# Altium schematic symbol library jlcpcb_2025_04_capacitors_extended_0603.schlib: 3668 symbols (part 18 of 20) (continued)
## JMK107BC6226MA-T
designator C?  Capacitance: 22uF  (hidden comment: *)
Capacitor, Ceramic (MLCC), 22uF, ±20%, 6.3V, X6S, ±20%, SMD 0603; Manufacturer: Taiyo Yuden; Manufacturer Part Number: JMK107BC6226MA-T; Package Size: 0603; JLCPCB Basic Part: No; JLCPCB Part Number: C386015; Supplier 1: LCSC; Category: Capacitors - MLCC; Supplier Part Number 1: C386015; Tolerance: ±20%; Voltage Rating: 6.3V; Temperature Coefficient: X6S; RoHS: Yes; ComponentLink1Description: Datasheet; ComponentLink1URL: https://wmsc.lcsc.com/wmsc/upload/file/pdf/v2/lcsc/2211282230_Taiyo-Yuden-JMK107BC6226MA-T_C386015.pdf; ComponentLink2Description: JLCPCB Part URL; ComponentLink2URL: https://jlcpcb.com/partdetail/C386015; ComponentLink3Description: LCSC Part URL; ComponentLink3URL: https://lcsc.com/product-detail/Multilayer-Ceramic-Capacitors-MLCC---SMD-SMT_Taiyo-Yuden-Taiyo-Yuden-JMK107BC6226MA-T_C386015.html
footprint CAP-0603 (0603 (1608M) Capacitor)
pins: 1, 2

## JMK107BJ106KA-T
designator C?  Capacitance: 10uF  (hidden comment: *)
Capacitor, Ceramic (MLCC), 10uF, ±10%, 6.3V, X5R, ±10%, SMD 0603; Manufacturer: Taiyo Yuden; Manufacturer Part Number: JMK107BJ106KA-T; Package Size: 0603; JLCPCB Basic Part: No; JLCPCB Part Number: C92782; Supplier 1: LCSC; Category: Capacitors - MLCC; Supplier Part Number 1: C92782; Tolerance: ±10%; Voltage Rating: 6.3V; Temperature Coefficient: X5R; RoHS: Yes; ComponentLink1Description: Datasheet; ComponentLink1URL: https://wmsc.lcsc.com/wmsc/upload/file/pdf/v2/lcsc/2304140030_Taiyo-Yuden-JMK107BJ106KA-T_C92782.pdf; ComponentLink2Description: JLCPCB Part URL; ComponentLink2URL: https://jlcpcb.com/partdetail/C92782; ComponentLink3Description: LCSC Part URL; ComponentLink3URL: https://lcsc.com/product-detail/Multilayer-Ceramic-Capacitors-MLCC---SMD-SMT_Taiyo-Yuden-Taiyo-Yuden-JMK107BJ106KA-T_C92782.html
footprint CAP-0603 (0603 (1608M) Capacitor)
pins: 1, 2

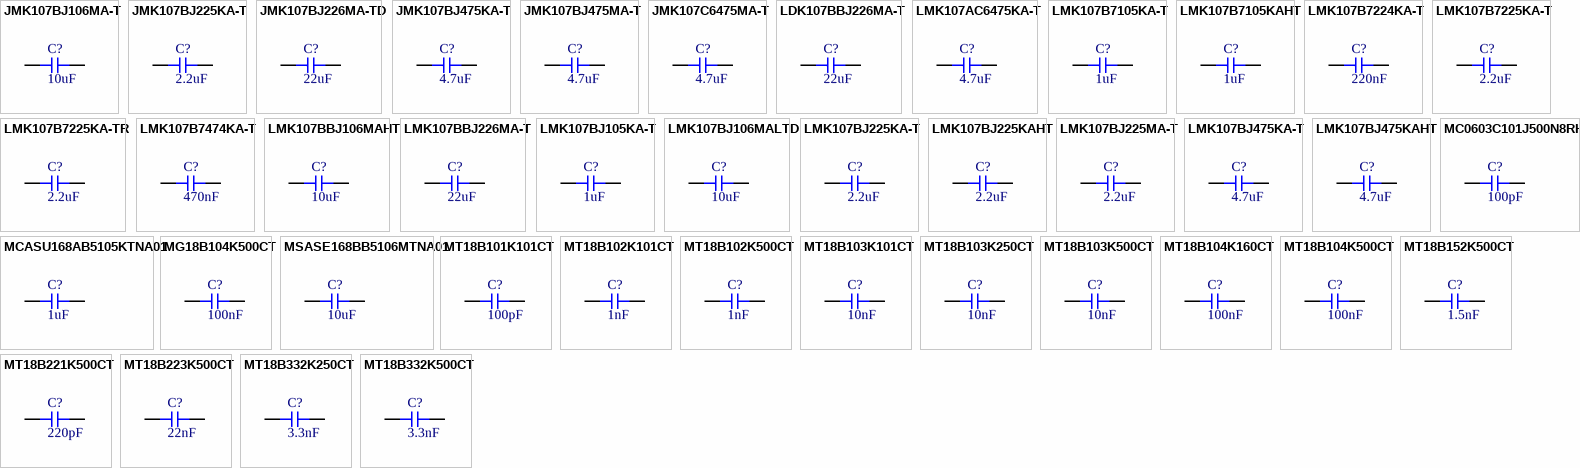
[diagram p82: symbols JMK107BJ106MA-T to MT18B332K500CT]

## JMK107BJ106MA-T
designator C?  Capacitance: 10uF  (hidden comment: *)
Capacitor, Ceramic (MLCC), 10uF, ±20%, 6.3V, X5R, ±20%, SMD 0603; Manufacturer: Taiyo Yuden; Manufacturer Part Number: JMK107BJ106MA-T; Package Size: 0603; JLCPCB Basic Part: No; JLCPCB Part Number: C87152; Supplier 1: LCSC; Category: Capacitors - MLCC; Supplier Part Number 1: C87152; Tolerance: ±20%; Voltage Rating: 6.3V; Temperature Coefficient: X5R; RoHS: Yes; ComponentLink1Description: Datasheet; ComponentLink1URL: https://wmsc.lcsc.com/wmsc/upload/file/pdf/v2/lcsc/2211282300_Taiyo-Yuden-JMK107BJ106MA-T_C87152.pdf; ComponentLink2Description: JLCPCB Part URL; ComponentLink2URL: https://jlcpcb.com/partdetail/C87152; ComponentLink3Description: LCSC Part URL; ComponentLink3URL: https://lcsc.com/product-detail/Multilayer-Ceramic-Capacitors-MLCC---SMD-SMT_Taiyo-Yuden-Taiyo-Yuden-JMK107BJ106MA-T_C87152.html
footprint CAP-0603 (0603 (1608M) Capacitor)
pins: 1, 2

## JMK107BJ225KA-T
designator C?  Capacitance: 2.2uF  (hidden comment: *)
Capacitor, Ceramic (MLCC), 2.2uF, ±10%, 6.3V, X5R, ±10%, SMD 0603; Manufacturer: Taiyo Yuden; Manufacturer Part Number: JMK107BJ225KA-T; Package Size: 0603; JLCPCB Basic Part: No; JLCPCB Part Number: C92783; Supplier 1: LCSC; Category: Capacitors - MLCC; Supplier Part Number 1: C92783; Tolerance: ±10%; Voltage Rating: 6.3V; Temperature Coefficient: X5R; RoHS: Yes; ComponentLink1Description: Datasheet; ComponentLink1URL: https://wmsc.lcsc.com/wmsc/upload/file/pdf/v2/lcsc/2211282300_Taiyo-Yuden-JMK107BJ225KA-T_C92783.pdf; ComponentLink2Description: JLCPCB Part URL; ComponentLink2URL: https://jlcpcb.com/partdetail/C92783; ComponentLink3Description: LCSC Part URL; ComponentLink3URL: https://lcsc.com/product-detail/Multilayer-Ceramic-Capacitors-MLCC---SMD-SMT_Taiyo-Yuden-Taiyo-Yuden-JMK107BJ225KA-T_C92783.html
footprint CAP-0603 (0603 (1608M) Capacitor)
pins: 1, 2

## JMK107BJ226MA-TD
designator C?  Capacitance: 22uF  (hidden comment: *)
Capacitor, Ceramic (MLCC), 22uF, ±20%, 6.3V, X5R, ±20%, SMD 0603; Manufacturer: Taiyo Yuden; Manufacturer Part Number: JMK107BJ226MA-TD; Package Size: 0603; JLCPCB Basic Part: No; JLCPCB Part Number: C386017; Supplier 1: LCSC; Category: Capacitors - MLCC; Supplier Part Number 1: C386017; Tolerance: ±20%; Voltage Rating: 6.3V; Temperature Coefficient: X5R; RoHS: Yes; ComponentLink1Description: Datasheet; ComponentLink1URL: https://wmsc.lcsc.com/wmsc/upload/file/pdf/v2/lcsc/2211282230_Taiyo-Yuden-JMK107BJ226MA-TD_C386017.pdf; ComponentLink2Description: JLCPCB Part URL; ComponentLink2URL: https://jlcpcb.com/partdetail/C386017; ComponentLink3Description: LCSC Part URL; ComponentLink3URL: https://lcsc.com/product-detail/Multilayer-Ceramic-Capacitors-MLCC---SMD-SMT_Taiyo-Yuden-Taiyo-Yuden-JMK107BJ226MA-TD_C386017.html
footprint CAP-0603 (0603 (1608M) Capacitor)
pins: 1, 2

## JMK107BJ475KA-T
designator C?  Capacitance: 4.7uF  (hidden comment: *)
Capacitor, Ceramic (MLCC), 4.7uF, ±10%, 6.3V, X5R, ±10%, SMD 0603; Manufacturer: Taiyo Yuden; Manufacturer Part Number: JMK107BJ475KA-T; Package Size: 0603; JLCPCB Basic Part: No; JLCPCB Part Number: C87151; Supplier 1: LCSC; Category: Capacitors - MLCC; Supplier Part Number 1: C87151; Tolerance: ±10%; Voltage Rating: 6.3V; Temperature Coefficient: X5R; RoHS: Yes; ComponentLink1Description: Datasheet; ComponentLink1URL: https://wmsc.lcsc.com/wmsc/upload/file/pdf/v2/lcsc/2304140030_Taiyo-Yuden-JMK107BJ475KA-T_C87151.pdf; ComponentLink2Description: JLCPCB Part URL; ComponentLink2URL: https://jlcpcb.com/partdetail/C87151; ComponentLink3Description: LCSC Part URL; ComponentLink3URL: https://lcsc.com/product-detail/Multilayer-Ceramic-Capacitors-MLCC---SMD-SMT_Taiyo-Yuden-Taiyo-Yuden-JMK107BJ475KA-T_C87151.html
footprint CAP-0603 (0603 (1608M) Capacitor)
pins: 1, 2

## JMK107BJ475MA-T
designator C?  Capacitance: 4.7uF  (hidden comment: *)
Capacitor, Ceramic (MLCC), 4.7uF, ±20%, 6.3V, X5R, ±20%, SMD 0603; Manufacturer: Taiyo Yuden; Manufacturer Part Number: JMK107BJ475MA-T; Package Size: 0603; JLCPCB Basic Part: No; JLCPCB Part Number: C412628; Supplier 1: LCSC; Category: Capacitors - MLCC; Supplier Part Number 1: C412628; Tolerance: ±20%; Voltage Rating: 6.3V; Temperature Coefficient: X5R; RoHS: Yes; ComponentLink1Description: Datasheet; ComponentLink1URL: https://wmsc.lcsc.com/wmsc/upload/file/pdf/v2/lcsc/2304140030_Taiyo-Yuden-JMK107BJ475MA-T_C412628.pdf; ComponentLink2Description: JLCPCB Part URL; ComponentLink2URL: https://jlcpcb.com/partdetail/C412628; ComponentLink3Description: LCSC Part URL; ComponentLink3URL: https://lcsc.com/product-detail/Multilayer-Ceramic-Capacitors-MLCC---SMD-SMT_Taiyo-Yuden-Taiyo-Yuden-JMK107BJ475MA-T_C412628.html
footprint CAP-0603 (0603 (1608M) Capacitor)
pins: 1, 2

## JMK107C6475MA-T
designator C?  Capacitance: 4.7uF  (hidden comment: *)
Capacitor, Ceramic (MLCC), 4.7uF, ±20%, 6.3V, X6S, ±20%, SMD 0603; Manufacturer: Taiyo Yuden; Manufacturer Part Number: JMK107C6475MA-T; Package Size: 0603; JLCPCB Basic Part: No; JLCPCB Part Number: C412629; Supplier 1: LCSC; Category: Capacitors - MLCC; Supplier Part Number 1: C412629; Tolerance: ±20%; Voltage Rating: 6.3V; Temperature Coefficient: X6S; RoHS: Yes; ComponentLink1Description: Datasheet; ComponentLink1URL: https://wmsc.lcsc.com/wmsc/upload/file/pdf/v2/lcsc/2304140030_Taiyo-Yuden-JMK107C6475MA-T_C412629.pdf; ComponentLink2Description: JLCPCB Part URL; ComponentLink2URL: https://jlcpcb.com/partdetail/C412629; ComponentLink3Description: LCSC Part URL; ComponentLink3URL: https://lcsc.com/product-detail/Multilayer-Ceramic-Capacitors-MLCC---SMD-SMT_Taiyo-Yuden-Taiyo-Yuden-JMK107C6475MA-T_C412629.html
footprint CAP-0603 (0603 (1608M) Capacitor)
pins: 1, 2

## LDK107BBJ226MA-T
designator C?  Capacitance: 22uF  (hidden comment: *)
Capacitor, Ceramic (MLCC), 22uF, ±20%, 10V, X5R, ±20%, SMD 0603; Manufacturer: Taiyo Yuden; Manufacturer Part Number: LDK107BBJ226MA-T; Package Size: 0603; JLCPCB Basic Part: No; JLCPCB Part Number: C337440; Supplier 1: LCSC; Category: Capacitors - MLCC; Supplier Part Number 1: C337440; Tolerance: ±20%; Voltage Rating: 10V; Temperature Coefficient: X5R; RoHS: Yes; ComponentLink1Description: Datasheet; ComponentLink1URL: https://wmsc.lcsc.com/wmsc/upload/file/pdf/v2/lcsc/2008171504_Taiyo-Yuden-LDK107BBJ226MA-T_C337440.pdf; ComponentLink2Description: JLCPCB Part URL; ComponentLink2URL: https://jlcpcb.com/partdetail/C337440; ComponentLink3Description: LCSC Part URL; ComponentLink3URL: https://lcsc.com/product-detail/Multilayer-Ceramic-Capacitors-MLCC---SMD-SMT_Taiyo-Yuden-Taiyo-Yuden-LDK107BBJ226MA-T_C337440.html
footprint CAP-0603 (0603 (1608M) Capacitor)
pins: 1, 2

## LMK107AC6475KA-T
designator C?  Capacitance: 4.7uF  (hidden comment: *)
Capacitor, Ceramic (MLCC), 4.7uF, ±10%, 10V, X6S, ±10%, SMD 0603; Manufacturer: Taiyo Yuden; Manufacturer Part Number: LMK107AC6475KA-T; Package Size: 0603; JLCPCB Basic Part: No; JLCPCB Part Number: C2175061; Supplier 1: LCSC; Category: Capacitors - MLCC; Supplier Part Number 1: C2175061; Tolerance: ±10%; Voltage Rating: 10V; Temperature Coefficient: X6S; RoHS: Yes; ComponentLink1Description: Datasheet; ComponentLink1URL: https://wmsc.lcsc.com/wmsc/upload/file/pdf/v2/lcsc/2309051422_Taiyo-Yuden-LMK107AC6475KA-T_C2175061.pdf; ComponentLink2Description: JLCPCB Part URL; ComponentLink2URL: https://jlcpcb.com/partdetail/C2175061; ComponentLink3Description: LCSC Part URL; ComponentLink3URL: https://lcsc.com/product-detail/Multilayer-Ceramic-Capacitors-MLCC---SMD-SMT_Taiyo-Yuden-Taiyo-Yuden-LMK107AC6475KA-T_C2175061.html
footprint CAP-0603 (0603 (1608M) Capacitor)
pins: 1, 2

## LMK107B7105KA-T
designator C?  Capacitance: 1uF  (hidden comment: *)
Capacitor, Ceramic (MLCC), 1uF, ±10%, 10V, X7R, ±10%, SMD 0603; Manufacturer: Taiyo Yuden; Manufacturer Part Number: LMK107B7105KA-T; Package Size: 0603; JLCPCB Basic Part: No; JLCPCB Part Number: C92806; Supplier 1: LCSC; Category: Capacitors - MLCC; Supplier Part Number 1: C92806; Tolerance: ±10%; Voltage Rating: 10V; Temperature Coefficient: X7R; RoHS: Yes; ComponentLink1Description: Datasheet; ComponentLink1URL: https://wmsc.lcsc.com/wmsc/upload/file/pdf/v2/lcsc/2211282300_Taiyo-Yuden-LMK107B7105KA-T_C92806.pdf; ComponentLink2Description: JLCPCB Part URL; ComponentLink2URL: https://jlcpcb.com/partdetail/C92806; ComponentLink3Description: LCSC Part URL; ComponentLink3URL: https://lcsc.com/product-detail/Multilayer-Ceramic-Capacitors-MLCC---SMD-SMT_Taiyo-Yuden-Taiyo-Yuden-LMK107B7105KA-T_C92806.html
footprint CAP-0603 (0603 (1608M) Capacitor)
pins: 1, 2

## LMK107B7105KAHT
designator C?  Capacitance: 1uF  (hidden comment: *)
Capacitor, Ceramic (MLCC), 1uF, ±10%, 10V, X7R, ±10%, SMD 0603; Manufacturer: Taiyo Yuden; Manufacturer Part Number: LMK107B7105KAHT; Package Size: 0603; JLCPCB Basic Part: No; JLCPCB Part Number: C386048; Supplier 1: LCSC; Category: Capacitors - MLCC; Supplier Part Number 1: C386048; Tolerance: ±10%; Voltage Rating: 10V; Temperature Coefficient: X7R; RoHS: Yes; ComponentLink1Description: Datasheet; ComponentLink1URL: https://wmsc.lcsc.com/wmsc/upload/file/pdf/v2/lcsc/2304140030_Taiyo-Yuden-LMK107B7105KAHT_C386048.pdf; ComponentLink2Description: JLCPCB Part URL; ComponentLink2URL: https://jlcpcb.com/partdetail/C386048; ComponentLink3Description: LCSC Part URL; ComponentLink3URL: https://lcsc.com/product-detail/Multilayer-Ceramic-Capacitors-MLCC---SMD-SMT_Taiyo-Yuden-Taiyo-Yuden-LMK107B7105KAHT_C386048.html
footprint CAP-0603 (0603 (1608M) Capacitor)
pins: 1, 2

## LMK107B7224KA-T
designator C?  Capacitance: 220nF  (hidden comment: *)
Capacitor, Ceramic (MLCC), 220nF, ±10%, 10V, X7R, ±10%, SMD 0603; Manufacturer: Taiyo Yuden; Manufacturer Part Number: LMK107B7224KA-T; Package Size: 0603; JLCPCB Basic Part: No; JLCPCB Part Number: C386049; Supplier 1: LCSC; Category: Capacitors - MLCC; Supplier Part Number 1: C386049; Tolerance: ±10%; Voltage Rating: 10V; Temperature Coefficient: X7R; RoHS: Yes; ComponentLink1Description: Datasheet; ComponentLink1URL: https://wmsc.lcsc.com/wmsc/upload/file/pdf/v2/lcsc/2304140030_Taiyo-Yuden-LMK107B7224KA-T_C386049.pdf; ComponentLink2Description: JLCPCB Part URL; ComponentLink2URL: https://jlcpcb.com/partdetail/C386049; ComponentLink3Description: LCSC Part URL; ComponentLink3URL: https://lcsc.com/product-detail/Multilayer-Ceramic-Capacitors-MLCC---SMD-SMT_Taiyo-Yuden-Taiyo-Yuden-LMK107B7224KA-T_C386049.html
footprint CAP-0603 (0603 (1608M) Capacitor)
pins: 1, 2

## LMK107B7225KA-T
designator C?  Capacitance: 2.2uF  (hidden comment: *)
Capacitor, Ceramic (MLCC), 2.2uF, ±10%, 10V, X7R, ±10%, SMD 0603; Manufacturer: Taiyo Yuden; Manufacturer Part Number: LMK107B7225KA-T; Package Size: 0603; JLCPCB Basic Part: No; JLCPCB Part Number: C386050; Supplier 1: LCSC; Category: Capacitors - MLCC; Supplier Part Number 1: C386050; Tolerance: ±10%; Voltage Rating: 10V; Temperature Coefficient: X7R; RoHS: Yes; ComponentLink1Description: Datasheet; ComponentLink1URL: https://wmsc.lcsc.com/wmsc/upload/file/pdf/v2/lcsc/2211282230_Taiyo-Yuden-LMK107B7225KA-T_C386050.pdf; ComponentLink2Description: JLCPCB Part URL; ComponentLink2URL: https://jlcpcb.com/partdetail/C386050; ComponentLink3Description: LCSC Part URL; ComponentLink3URL: https://lcsc.com/product-detail/Multilayer-Ceramic-Capacitors-MLCC---SMD-SMT_Taiyo-Yuden-Taiyo-Yuden-LMK107B7225KA-T_C386050.html
footprint CAP-0603 (0603 (1608M) Capacitor)
pins: 1, 2

## LMK107B7225KA-TR
designator C?  Capacitance: 2.2uF  (hidden comment: *)
Capacitor, Ceramic (MLCC), 2.2uF, ±10%, 10V, X7R, ±10%, SMD 0603; Manufacturer: Taiyo Yuden; Manufacturer Part Number: LMK107B7225KA-TR; Package Size: 0603; JLCPCB Basic Part: No; JLCPCB Part Number: C268026; Supplier 1: LCSC; Category: Capacitors - MLCC; Supplier Part Number 1: C268026; Tolerance: ±10%; Voltage Rating: 10V; Temperature Coefficient: X7R; RoHS: Yes; ComponentLink1Description: Datasheet; ComponentLink1URL: https://wmsc.lcsc.com/wmsc/upload/file/pdf/v2/lcsc/2211282230_Taiyo-Yuden-LMK107B7225KA-TR_C268026.pdf; ComponentLink2Description: JLCPCB Part URL; ComponentLink2URL: https://jlcpcb.com/partdetail/C268026; ComponentLink3Description: LCSC Part URL; ComponentLink3URL: https://lcsc.com/product-detail/Multilayer-Ceramic-Capacitors-MLCC---SMD-SMT_Taiyo-Yuden-Taiyo-Yuden-LMK107B7225KA-TR_C268026.html
footprint CAP-0603 (0603 (1608M) Capacitor)
pins: 1, 2

## LMK107B7474KA-T
designator C?  Capacitance: 470nF  (hidden comment: *)
Capacitor, Ceramic (MLCC), 470nF, ±10%, 10V, X7R, ±10%, SMD 0603; Manufacturer: Taiyo Yuden; Manufacturer Part Number: LMK107B7474KA-T; Package Size: 0603; JLCPCB Basic Part: No; JLCPCB Part Number: C478850; Supplier 1: LCSC; Category: Capacitors - MLCC; Supplier Part Number 1: C478850; Tolerance: ±10%; Voltage Rating: 10V; Temperature Coefficient: X7R; RoHS: Yes; ComponentLink1Description: Datasheet; ComponentLink1URL: https://wmsc.lcsc.com/wmsc/upload/file/pdf/v2/lcsc/2211282230_Taiyo-Yuden-LMK107B7474KA-T_C478850.pdf; ComponentLink2Description: JLCPCB Part URL; ComponentLink2URL: https://jlcpcb.com/partdetail/C478850; ComponentLink3Description: LCSC Part URL; ComponentLink3URL: https://lcsc.com/product-detail/Multilayer-Ceramic-Capacitors-MLCC---SMD-SMT_Taiyo-Yuden-Taiyo-Yuden-LMK107B7474KA-T_C478850.html
footprint CAP-0603 (0603 (1608M) Capacitor)
pins: 1, 2

## LMK107BBJ106MAHT
designator C?  Capacitance: 10uF  (hidden comment: *)
Capacitor, Ceramic (MLCC), 10uF, ±20%, 10V, X5R, ±20%, SMD 0603; Manufacturer: Taiyo Yuden; Manufacturer Part Number: LMK107BBJ106MAHT; Package Size: 0603; JLCPCB Basic Part: No; JLCPCB Part Number: C386052; Supplier 1: LCSC; Category: Capacitors - MLCC; Supplier Part Number 1: C386052; Tolerance: ±20%; Voltage Rating: 10V; Temperature Coefficient: X5R; RoHS: Yes; ComponentLink1Description: Datasheet; ComponentLink1URL: https://wmsc.lcsc.com/wmsc/upload/file/pdf/v2/lcsc/2304140030_Taiyo-Yuden-LMK107BBJ106MAHT_C386052.pdf; ComponentLink2Description: JLCPCB Part URL; ComponentLink2URL: https://jlcpcb.com/partdetail/C386052; ComponentLink3Description: LCSC Part URL; ComponentLink3URL: https://lcsc.com/product-detail/Multilayer-Ceramic-Capacitors-MLCC---SMD-SMT_Taiyo-Yuden-Taiyo-Yuden-LMK107BBJ106MAHT_C386052.html
footprint CAP-0603 (0603 (1608M) Capacitor)
pins: 1, 2

## LMK107BBJ226MA-T
designator C?  Capacitance: 22uF  (hidden comment: *)
Capacitor, Ceramic (MLCC), 22uF, ±20%, 10V, X5R, ±20%, SMD 0603; Manufacturer: Taiyo Yuden; Manufacturer Part Number: LMK107BBJ226MA-T; Package Size: 0603; JLCPCB Basic Part: No; JLCPCB Part Number: C386053; Supplier 1: LCSC; Category: Capacitors - MLCC; Supplier Part Number 1: C386053; Tolerance: ±20%; Voltage Rating: 10V; Temperature Coefficient: X5R; RoHS: Yes; ComponentLink1Description: Datasheet; ComponentLink1URL: https://wmsc.lcsc.com/wmsc/upload/file/pdf/v2/lcsc/2304140030_Taiyo-Yuden-LMK107BBJ226MA-T_C386053.pdf; ComponentLink2Description: JLCPCB Part URL; ComponentLink2URL: https://jlcpcb.com/partdetail/C386053; ComponentLink3Description: LCSC Part URL; ComponentLink3URL: https://lcsc.com/product-detail/Multilayer-Ceramic-Capacitors-MLCC---SMD-SMT_Taiyo-Yuden-Taiyo-Yuden-LMK107BBJ226MA-T_C386053.html
footprint CAP-0603 (0603 (1608M) Capacitor)
pins: 1, 2

## LMK107BJ105KA-T
designator C?  Capacitance: 1uF  (hidden comment: *)
Capacitor, Ceramic (MLCC), 1uF, ±10%, 10V, X5R, ±10%, SMD 0603; Manufacturer: Taiyo Yuden; Manufacturer Part Number: LMK107BJ105KA-T; Package Size: 0603; JLCPCB Basic Part: No; JLCPCB Part Number: C92807; Supplier 1: LCSC; Category: Capacitors - MLCC; Supplier Part Number 1: C92807; Tolerance: ±10%; Voltage Rating: 10V; Temperature Coefficient: X5R; RoHS: Yes; ComponentLink1Description: Datasheet; ComponentLink1URL: https://wmsc.lcsc.com/wmsc/upload/file/pdf/v2/lcsc/1912111437_Taiyo-Yuden-LMK107BJ105KA-T_C92807.pdf; ComponentLink2Description: JLCPCB Part URL; ComponentLink2URL: https://jlcpcb.com/partdetail/C92807; ComponentLink3Description: LCSC Part URL; ComponentLink3URL: https://lcsc.com/product-detail/Multilayer-Ceramic-Capacitors-MLCC---SMD-SMT_Taiyo-Yuden-Taiyo-Yuden-LMK107BJ105KA-T_C92807.html
footprint CAP-0603 (0603 (1608M) Capacitor)
pins: 1, 2

## LMK107BJ106MALTD
designator C?  Capacitance: 10uF  (hidden comment: *)
Capacitor, Ceramic (MLCC), 10uF, ±20%, 10V, X5R, ±20%, SMD 0603; Manufacturer: Taiyo Yuden; Manufacturer Part Number: LMK107BJ106MALTD; Package Size: 0603; JLCPCB Basic Part: No; JLCPCB Part Number: C18800; Supplier 1: LCSC; Category: Capacitors - MLCC; Supplier Part Number 1: C18800; Tolerance: ±20%; Voltage Rating: 10V; Temperature Coefficient: X5R; RoHS: Yes; ComponentLink1Description: Datasheet; ComponentLink1URL: https://wmsc.lcsc.com/wmsc/upload/file/pdf/v2/lcsc/2304140030_Taiyo-Yuden-LMK107BJ106MALTD_C18800.pdf; ComponentLink2Description: JLCPCB Part URL; ComponentLink2URL: https://jlcpcb.com/partdetail/C18800; ComponentLink3Description: LCSC Part URL; ComponentLink3URL: https://lcsc.com/product-detail/Multilayer-Ceramic-Capacitors-MLCC---SMD-SMT_Taiyo-Yuden-Taiyo-Yuden-LMK107BJ106MALTD_C18800.html
footprint CAP-0603 (0603 (1608M) Capacitor)
pins: 1, 2

## LMK107BJ225KA-T
designator C?  Capacitance: 2.2uF  (hidden comment: *)
Capacitor, Ceramic (MLCC), 2.2uF, ±10%, 10V, X5R, ±10%, SMD 0603; Manufacturer: Taiyo Yuden; Manufacturer Part Number: LMK107BJ225KA-T; Package Size: 0603; JLCPCB Basic Part: No; JLCPCB Part Number: C87150; Supplier 1: LCSC; Category: Capacitors - MLCC; Supplier Part Number 1: C87150; Tolerance: ±10%; Voltage Rating: 10V; Temperature Coefficient: X5R; RoHS: Yes; ComponentLink1Description: Datasheet; ComponentLink1URL: https://wmsc.lcsc.com/wmsc/upload/file/pdf/v2/lcsc/2211282300_Taiyo-Yuden-LMK107BJ225KA-T_C87150.pdf; ComponentLink2Description: JLCPCB Part URL; ComponentLink2URL: https://jlcpcb.com/partdetail/C87150; ComponentLink3Description: LCSC Part URL; ComponentLink3URL: https://lcsc.com/product-detail/Multilayer-Ceramic-Capacitors-MLCC---SMD-SMT_Taiyo-Yuden-Taiyo-Yuden-LMK107BJ225KA-T_C87150.html
footprint CAP-0603 (0603 (1608M) Capacitor)
pins: 1, 2

## LMK107BJ225KAHT
designator C?  Capacitance: 2.2uF  (hidden comment: *)
Capacitor, Ceramic (MLCC), 2.2uF, ±10%, 10V, X5R, ±10%, SMD 0603; Manufacturer: Taiyo Yuden; Manufacturer Part Number: LMK107BJ225KAHT; Package Size: 0603; JLCPCB Basic Part: No; JLCPCB Part Number: C650974; Supplier 1: LCSC; Category: Capacitors - MLCC; Supplier Part Number 1: C650974; Tolerance: ±10%; Voltage Rating: 10V; Temperature Coefficient: X5R; RoHS: Yes; ComponentLink1Description: Datasheet; ComponentLink1URL: https://wmsc.lcsc.com/wmsc/upload/file/pdf/v2/lcsc/2304140030_Taiyo-Yuden-LMK107BJ225KAHT_C650974.pdf; ComponentLink2Description: JLCPCB Part URL; ComponentLink2URL: https://jlcpcb.com/partdetail/C650974; ComponentLink3Description: LCSC Part URL; ComponentLink3URL: https://lcsc.com/product-detail/Multilayer-Ceramic-Capacitors-MLCC---SMD-SMT_Taiyo-Yuden-Taiyo-Yuden-LMK107BJ225KAHT_C650974.html
footprint CAP-0603 (0603 (1608M) Capacitor)
pins: 1, 2

## LMK107BJ225MA-T
designator C?  Capacitance: 2.2uF  (hidden comment: *)
Capacitor, Ceramic (MLCC), 2.2uF, ±20%, 10V, X5R, ±20%, SMD 0603; Manufacturer: Taiyo Yuden; Manufacturer Part Number: LMK107BJ225MA-T; Package Size: 0603; JLCPCB Basic Part: No; JLCPCB Part Number: C386055; Supplier 1: LCSC; Category: Capacitors - MLCC; Supplier Part Number 1: C386055; Tolerance: ±20%; Voltage Rating: 10V; Temperature Coefficient: X5R; RoHS: Yes; ComponentLink1Description: Datasheet; ComponentLink1URL: https://wmsc.lcsc.com/wmsc/upload/file/pdf/v2/lcsc/2304140030_Taiyo-Yuden-LMK107BJ225MA-T_C386055.pdf; ComponentLink2Description: JLCPCB Part URL; ComponentLink2URL: https://jlcpcb.com/partdetail/C386055; ComponentLink3Description: LCSC Part URL; ComponentLink3URL: https://lcsc.com/product-detail/Multilayer-Ceramic-Capacitors-MLCC---SMD-SMT_Taiyo-Yuden-Taiyo-Yuden-LMK107BJ225MA-T_C386055.html
footprint CAP-0603 (0603 (1608M) Capacitor)
pins: 1, 2

## LMK107BJ475KA-T
designator C?  Capacitance: 4.7uF  (hidden comment: *)
Capacitor, Ceramic (MLCC), 4.7uF, ±10%, 10V, X5R, ±10%, SMD 0603; Manufacturer: Taiyo Yuden; Manufacturer Part Number: LMK107BJ475KA-T; Package Size: 0603; JLCPCB Basic Part: No; JLCPCB Part Number: C92808; Supplier 1: LCSC; Category: Capacitors - MLCC; Supplier Part Number 1: C92808; Tolerance: ±10%; Voltage Rating: 10V; Temperature Coefficient: X5R; RoHS: Yes; ComponentLink1Description: Datasheet; ComponentLink1URL: https://wmsc.lcsc.com/wmsc/upload/file/pdf/v2/lcsc/1811072112_Taiyo-Yuden-LMK107BJ475KA-T_C92808.pdf; ComponentLink2Description: JLCPCB Part URL; ComponentLink2URL: https://jlcpcb.com/partdetail/C92808; ComponentLink3Description: LCSC Part URL; ComponentLink3URL: https://lcsc.com/product-detail/Multilayer-Ceramic-Capacitors-MLCC---SMD-SMT_Taiyo-Yuden-Taiyo-Yuden-LMK107BJ475KA-T_C92808.html
footprint CAP-0603 (0603 (1608M) Capacitor)
pins: 1, 2

## LMK107BJ475KAHT
designator C?  Capacitance: 4.7uF  (hidden comment: *)
Capacitor, Ceramic (MLCC), 4.7uF, ±10%, 10V, X5R, ±10%, SMD 0603; Manufacturer: Taiyo Yuden; Manufacturer Part Number: LMK107BJ475KAHT; Package Size: 0603; JLCPCB Basic Part: No; JLCPCB Part Number: C412454; Supplier 1: LCSC; Category: Capacitors - MLCC; Supplier Part Number 1: C412454; Tolerance: ±10%; Voltage Rating: 10V; Temperature Coefficient: X5R; RoHS: Yes; ComponentLink1Description: Datasheet; ComponentLink1URL: https://wmsc.lcsc.com/wmsc/upload/file/pdf/v2/lcsc/2304140030_Taiyo-Yuden-LMK107BJ475KAHT_C412454.pdf; ComponentLink2Description: JLCPCB Part URL; ComponentLink2URL: https://jlcpcb.com/partdetail/C412454; ComponentLink3Description: LCSC Part URL; ComponentLink3URL: https://lcsc.com/product-detail/Multilayer-Ceramic-Capacitors-MLCC---SMD-SMT_Taiyo-Yuden-Taiyo-Yuden-LMK107BJ475KAHT_C412454.html
footprint CAP-0603 (0603 (1608M) Capacitor)
pins: 1, 2

## MC0603C101J500N8RH
designator C?  Capacitance: 100pF  (hidden comment: *)
Capacitor, Ceramic (MLCC), 100pF, 50V, SMD 0603; Manufacturer: Sunway; Manufacturer Part Number: MC0603C101J500N8RH; Package Size: 0603; JLCPCB Basic Part: No; JLCPCB Part Number: C3152564; Supplier 1: LCSC; Category: Capacitors - MLCC; Supplier Part Number 1: C3152564; Voltage Rating: 50V; RoHS: Yes; ComponentLink1Description: Datasheet; ComponentLink1URL: https://datasheet.lcsc.com/lcsc/2207271800_Sunway-MC0603C101J500N8RH_C3152564.pdf; ComponentLink2Description: JLCPCB Part URL; ComponentLink2URL: https://jlcpcb.com/partdetail/C3152564; ComponentLink3Description: LCSC Part URL; ComponentLink3URL: https://lcsc.com/product-detail/Multilayer-Ceramic-Capacitors-MLCC---SMD-SMT_Sunway-Sunway-MC0603C101J500N8RH_C3152564.html
footprint CAP-0603 (0603 (1608M) Capacitor)
pins: 1, 2

## MCASU168AB5105KTNA01
designator C?  Capacitance: 1uF  (hidden comment: *)
Capacitor, Ceramic (MLCC), 1uF, ±10%, null, X5R, ±10%, SMD 0603; Manufacturer: Taiyo Yuden; Manufacturer Part Number: MCASU168AB5105KTNA01; Package Size: 0603; JLCPCB Basic Part: No; JLCPCB Part Number: C5177281; Supplier 1: LCSC; Category: Capacitors - MLCC; Supplier Part Number 1: C5177281; Tolerance: ±10%; Voltage Rating: null; Temperature Coefficient: X5R; RoHS: Yes; ComponentLink1Description: Datasheet; ComponentLink1URL: https://wmsc.lcsc.com/wmsc/upload/file/pdf/v2/lcsc/2209210930_Taiyo-Yuden-MCASU168AB5105KTNA01_C5177281.pdf; ComponentLink2Description: JLCPCB Part URL; ComponentLink2URL: https://jlcpcb.com/partdetail/C5177281; ComponentLink3Description: LCSC Part URL; ComponentLink3URL: https://lcsc.com/product-detail/Multilayer-Ceramic-Capacitors-MLCC---SMD-SMT_Taiyo-Yuden-Taiyo-Yuden-MCASU168AB5105KTNA01_C5177281.html
footprint CAP-0603 (0603 (1608M) Capacitor)
pins: 1, 2

## MG18B104K500CT
designator C?  Capacitance: 100nF  (hidden comment: *)
Capacitor, Ceramic (MLCC), 100nF, ±10%, 50V, X7R, ±10%, SMD 0603; Manufacturer: Walsin Tech Corp; Manufacturer Part Number: MG18B104K500CT; Package Size: 0603; JLCPCB Basic Part: No; JLCPCB Part Number: C327792; Supplier 1: LCSC; Category: Capacitors - MLCC; Supplier Part Number 1: C327792; Tolerance: ±10%; Voltage Rating: 50V; Temperature Coefficient: X7R; RoHS: Yes; ComponentLink1Description: Datasheet; ComponentLink1URL: https://wmsc.lcsc.com/wmsc/upload/file/pdf/v2/lcsc/2304140030_Walsin-Tech-Corp-MG18B104K500CT_C327792.pdf; ComponentLink2Description: JLCPCB Part URL; ComponentLink2URL: https://jlcpcb.com/partdetail/C327792; ComponentLink3Description: LCSC Part URL; ComponentLink3URL: https://lcsc.com/product-detail/Multilayer-Ceramic-Capacitors-MLCC---SMD-SMT_Walsin-Tech-Corp-Walsin-Tech-Corp-MG18B104K500CT_C327792.html
footprint CAP-0603 (0603 (1608M) Capacitor)
pins: 1, 2

## MSASE168BB5106MTNA01
designator C?  Capacitance: 10uF  (hidden comment: *)
Capacitor, Ceramic (MLCC), 10uF, ±20%, 16V, X5R, ±20%, SMD 0603; Manufacturer: Taiyo Yuden; Manufacturer Part Number: MSASE168BB5106MTNA01; Package Size: 0603; JLCPCB Basic Part: No; JLCPCB Part Number: C90058; Supplier 1: LCSC; Category: Capacitors - MLCC; Supplier Part Number 1: C90058; Tolerance: ±20%; Voltage Rating: 16V; Temperature Coefficient: X5R; RoHS: Yes; ComponentLink1Description: Datasheet; ComponentLink1URL: https://wmsc.lcsc.com/wmsc/upload/file/pdf/v2/lcsc/2306121046_Taiyo-Yuden-MSASE168BB5106MTNA01_C90058.pdf; ComponentLink2Description: JLCPCB Part URL; ComponentLink2URL: https://jlcpcb.com/partdetail/C90058; ComponentLink3Description: LCSC Part URL; ComponentLink3URL: https://lcsc.com/product-detail/Multilayer-Ceramic-Capacitors-MLCC---SMD-SMT_Taiyo-Yuden-Taiyo-Yuden-EMK107BBJ106MA-T_C90058.html
footprint CAP-0603 (0603 (1608M) Capacitor)
pins: 1, 2

## MT18B101K101CT
designator C?  Capacitance: 100pF  (hidden comment: *)
Capacitor, Ceramic (MLCC), 100pF, ±10%, 100V, X7R, ±10%, SMD 0603; Manufacturer: Walsin Tech Corp; Manufacturer Part Number: MT18B101K101CT; Package Size: 0603; JLCPCB Basic Part: No; JLCPCB Part Number: C458956; Supplier 1: LCSC; Category: Capacitors - MLCC; Supplier Part Number 1: C458956; Tolerance: ±10%; Voltage Rating: 100V; Temperature Coefficient: X7R; RoHS: Yes; ComponentLink1Description: Datasheet; ComponentLink1URL: https://wmsc.lcsc.com/wmsc/upload/file/pdf/v2/lcsc/2304140030_Walsin-Tech-Corp-MT18B101K101CT_C458956.pdf; ComponentLink2Description: JLCPCB Part URL; ComponentLink2URL: https://jlcpcb.com/partdetail/C458956; ComponentLink3Description: LCSC Part URL; ComponentLink3URL: https://lcsc.com/product-detail/Multilayer-Ceramic-Capacitors-MLCC---SMD-SMT_Walsin-Tech-Corp-Walsin-Tech-Corp-MT18B101K101CT_C458956.html
footprint CAP-0603 (0603 (1608M) Capacitor)
pins: 1, 2

## MT18B102K101CT
designator C?  Capacitance: 1nF  (hidden comment: *)
Capacitor, Ceramic (MLCC), 1nF, ±10%, 100V, X7R, ±10%, SMD 0603; Manufacturer: Walsin Tech Corp; Manufacturer Part Number: MT18B102K101CT; Package Size: 0603; JLCPCB Basic Part: No; JLCPCB Part Number: C458957; Supplier 1: LCSC; Category: Capacitors - MLCC; Supplier Part Number 1: C458957; Tolerance: ±10%; Voltage Rating: 100V; Temperature Coefficient: X7R; RoHS: Yes; ComponentLink1Description: Datasheet; ComponentLink1URL: https://wmsc.lcsc.com/wmsc/upload/file/pdf/v2/lcsc/2304140030_Walsin-Tech-Corp-MT18B102K101CT_C458957.pdf; ComponentLink2Description: JLCPCB Part URL; ComponentLink2URL: https://jlcpcb.com/partdetail/C458957; ComponentLink3Description: LCSC Part URL; ComponentLink3URL: https://lcsc.com/product-detail/Multilayer-Ceramic-Capacitors-MLCC---SMD-SMT_Walsin-Tech-Corp-Walsin-Tech-Corp-MT18B102K101CT_C458957.html
footprint CAP-0603 (0603 (1608M) Capacitor)
pins: 1, 2

## MT18B102K500CT
designator C?  Capacitance: 1nF  (hidden comment: *)
Capacitor, Ceramic (MLCC), 1nF, ±10%, 50V, X7R, ±10%, SMD 0603; Manufacturer: Walsin Tech Corp; Manufacturer Part Number: MT18B102K500CT; Package Size: 0603; JLCPCB Basic Part: No; JLCPCB Part Number: C323574; Supplier 1: LCSC; Category: Capacitors - MLCC; Supplier Part Number 1: C323574; Tolerance: ±10%; Voltage Rating: 50V; Temperature Coefficient: X7R; RoHS: Yes; ComponentLink1Description: Datasheet; ComponentLink1URL: https://wmsc.lcsc.com/wmsc/upload/file/pdf/v2/lcsc/2304140030_Walsin-Tech-Corp-MT18B102K500CT_C323574.pdf; ComponentLink2Description: JLCPCB Part URL; ComponentLink2URL: https://jlcpcb.com/partdetail/C323574; ComponentLink3Description: LCSC Part URL; ComponentLink3URL: https://lcsc.com/product-detail/Multilayer-Ceramic-Capacitors-MLCC---SMD-SMT_Walsin-Tech-Corp-Walsin-Tech-Corp-MT18B102K500CT_C323574.html
footprint CAP-0603 (0603 (1608M) Capacitor)
pins: 1, 2

## MT18B103K101CT
designator C?  Capacitance: 10nF  (hidden comment: *)
Capacitor, Ceramic (MLCC), 10nF, ±10%, 100V, X7R, ±10%, SMD 0603; Manufacturer: Walsin Tech Corp; Manufacturer Part Number: MT18B103K101CT; Package Size: 0603; JLCPCB Basic Part: No; JLCPCB Part Number: C2909419; Supplier 1: LCSC; Category: Capacitors - MLCC; Supplier Part Number 1: C2909419; Tolerance: ±10%; Voltage Rating: 100V; Temperature Coefficient: X7R; RoHS: Yes; ComponentLink1Description: Datasheet; ComponentLink1URL: https://wmsc.lcsc.com/wmsc/upload/file/pdf/v2/lcsc/2110281730_Walsin-Tech-Corp-MT18B103K101CT_C2909419.pdf; ComponentLink2Description: JLCPCB Part URL; ComponentLink2URL: https://jlcpcb.com/partdetail/C2909419; ComponentLink3Description: LCSC Part URL; ComponentLink3URL: https://lcsc.com/product-detail/Multilayer-Ceramic-Capacitors-MLCC---SMD-SMT_Walsin-Tech-Corp-Walsin-Tech-Corp-MT18B103K101CT_C2909419.html
footprint CAP-0603 (0603 (1608M) Capacitor)
pins: 1, 2

## MT18B103K250CT
designator C?  Capacitance: 10nF  (hidden comment: *)
Capacitor, Ceramic (MLCC), 10nF, ±10%, 25V, X7R, ±10%, SMD 0603; Manufacturer: Walsin Tech Corp; Manufacturer Part Number: MT18B103K250CT; Package Size: 0603; JLCPCB Basic Part: No; JLCPCB Part Number: C323573; Supplier 1: LCSC; Category: Capacitors - MLCC; Supplier Part Number 1: C323573; Tolerance: ±10%; Voltage Rating: 25V; Temperature Coefficient: X7R; RoHS: Yes; ComponentLink1Description: Datasheet; ComponentLink1URL: https://wmsc.lcsc.com/wmsc/upload/file/pdf/v2/lcsc/2304140030_Walsin-Tech-Corp-MT18B103K250CT_C323573.pdf; ComponentLink2Description: JLCPCB Part URL; ComponentLink2URL: https://jlcpcb.com/partdetail/C323573; ComponentLink3Description: LCSC Part URL; ComponentLink3URL: https://lcsc.com/product-detail/Multilayer-Ceramic-Capacitors-MLCC---SMD-SMT_Walsin-Tech-Corp-Walsin-Tech-Corp-MT18B103K250CT_C323573.html
footprint CAP-0603 (0603 (1608M) Capacitor)
pins: 1, 2

## MT18B103K500CT
designator C?  Capacitance: 10nF  (hidden comment: *)
Capacitor, Ceramic (MLCC), 10nF, ±10%, 50V, X7R, ±10%, SMD 0603; Manufacturer: Walsin Tech Corp; Manufacturer Part Number: MT18B103K500CT; Package Size: 0603; JLCPCB Basic Part: No; JLCPCB Part Number: C323572; Supplier 1: LCSC; Category: Capacitors - MLCC; Supplier Part Number 1: C323572; Tolerance: ±10%; Voltage Rating: 50V; Temperature Coefficient: X7R; RoHS: Yes; ComponentLink1Description: Datasheet; ComponentLink1URL: https://wmsc.lcsc.com/wmsc/upload/file/pdf/v2/lcsc/2304140030_Walsin-Tech-Corp-MT18B103K500CT_C323572.pdf; ComponentLink2Description: JLCPCB Part URL; ComponentLink2URL: https://jlcpcb.com/partdetail/C323572; ComponentLink3Description: LCSC Part URL; ComponentLink3URL: https://lcsc.com/product-detail/Multilayer-Ceramic-Capacitors-MLCC---SMD-SMT_Walsin-Tech-Corp-Walsin-Tech-Corp-MT18B103K500CT_C323572.html
footprint CAP-0603 (0603 (1608M) Capacitor)
pins: 1, 2

## MT18B104K160CT
designator C?  Capacitance: 100nF  (hidden comment: *)
Capacitor, Ceramic (MLCC), 100nF, ±10%, 16V, X7R, ±10%, SMD 0603; Manufacturer: Walsin Tech Corp; Manufacturer Part Number: MT18B104K160CT; Package Size: 0603; JLCPCB Basic Part: No; JLCPCB Part Number: C323571; Supplier 1: LCSC; Category: Capacitors - MLCC; Supplier Part Number 1: C323571; Tolerance: ±10%; Voltage Rating: 16V; Temperature Coefficient: X7R; RoHS: Yes; ComponentLink1Description: Datasheet; ComponentLink1URL: https://wmsc.lcsc.com/wmsc/upload/file/pdf/v2/lcsc/2304140030_Walsin-Tech-Corp-MT18B104K160CT_C323571.pdf; ComponentLink2Description: JLCPCB Part URL; ComponentLink2URL: https://jlcpcb.com/partdetail/C323571; ComponentLink3Description: LCSC Part URL; ComponentLink3URL: https://lcsc.com/product-detail/Multilayer-Ceramic-Capacitors-MLCC---SMD-SMT_Walsin-Tech-Corp-Walsin-Tech-Corp-MT18B104K160CT_C323571.html
footprint CAP-0603 (0603 (1608M) Capacitor)
pins: 1, 2

## MT18B104K500CT
designator C?  Capacitance: 100nF  (hidden comment: *)
Capacitor, Ceramic (MLCC), 100nF, ±10%, 50V, X7R, ±10%, SMD 0603; Manufacturer: Walsin Tech Corp; Manufacturer Part Number: MT18B104K500CT; Package Size: 0603; JLCPCB Basic Part: No; JLCPCB Part Number: C323570; Supplier 1: LCSC; Category: Capacitors - MLCC; Supplier Part Number 1: C323570; Tolerance: ±10%; Voltage Rating: 50V; Temperature Coefficient: X7R; RoHS: Yes; ComponentLink1Description: Datasheet; ComponentLink1URL: https://wmsc.lcsc.com/wmsc/upload/file/pdf/v2/lcsc/2304140030_Walsin-Tech-Corp-MT18B104K500CT_C323570.pdf; ComponentLink2Description: JLCPCB Part URL; ComponentLink2URL: https://jlcpcb.com/partdetail/C323570; ComponentLink3Description: LCSC Part URL; ComponentLink3URL: https://lcsc.com/product-detail/Multilayer-Ceramic-Capacitors-MLCC---SMD-SMT_Walsin-Tech-Corp-Walsin-Tech-Corp-MT18B104K500CT_C323570.html
footprint CAP-0603 (0603 (1608M) Capacitor)
pins: 1, 2

## MT18B152K500CT
designator C?  Capacitance: 1.5nF  (hidden comment: *)
Capacitor, Ceramic (MLCC), 1.5nF, ±10%, 50V, X7R, ±10%, SMD 0603; Manufacturer: Walsin Tech Corp; Manufacturer Part Number: MT18B152K500CT; Package Size: 0603; JLCPCB Basic Part: No; JLCPCB Part Number: C323569; Supplier 1: LCSC; Category: Capacitors - MLCC; Supplier Part Number 1: C323569; Tolerance: ±10%; Voltage Rating: 50V; Temperature Coefficient: X7R; RoHS: Yes; ComponentLink1Description: Datasheet; ComponentLink1URL: https://wmsc.lcsc.com/wmsc/upload/file/pdf/v2/lcsc/2304140030_Walsin-Tech-Corp-MT18B152K500CT_C323569.pdf; ComponentLink2Description: JLCPCB Part URL; ComponentLink2URL: https://jlcpcb.com/partdetail/C323569; ComponentLink3Description: LCSC Part URL; ComponentLink3URL: https://lcsc.com/product-detail/Multilayer-Ceramic-Capacitors-MLCC---SMD-SMT_Walsin-Tech-Corp-Walsin-Tech-Corp-MT18B152K500CT_C323569.html
footprint CAP-0603 (0603 (1608M) Capacitor)
pins: 1, 2

## MT18B221K500CT
designator C?  Capacitance: 220pF  (hidden comment: *)
Capacitor, Ceramic (MLCC), 220pF, ±10%, 50V, X7R, ±10%, SMD 0603; Manufacturer: Walsin Tech Corp; Manufacturer Part Number: MT18B221K500CT; Package Size: 0603; JLCPCB Basic Part: No; JLCPCB Part Number: C323568; Supplier 1: LCSC; Category: Capacitors - MLCC; Supplier Part Number 1: C323568; Tolerance: ±10%; Voltage Rating: 50V; Temperature Coefficient: X7R; RoHS: Yes; ComponentLink1Description: Datasheet; ComponentLink1URL: https://wmsc.lcsc.com/wmsc/upload/file/pdf/v2/lcsc/2304140030_Walsin-Tech-Corp-MT18B221K500CT_C323568.pdf; ComponentLink2Description: JLCPCB Part URL; ComponentLink2URL: https://jlcpcb.com/partdetail/C323568; ComponentLink3Description: LCSC Part URL; ComponentLink3URL: https://lcsc.com/product-detail/Multilayer-Ceramic-Capacitors-MLCC---SMD-SMT_Walsin-Tech-Corp-Walsin-Tech-Corp-MT18B221K500CT_C323568.html
footprint CAP-0603 (0603 (1608M) Capacitor)
pins: 1, 2

## MT18B223K500CT
designator C?  Capacitance: 22nF  (hidden comment: *)
Capacitor, Ceramic (MLCC), 22nF, ±10%, 50V, X7R, ±10%, SMD 0603; Manufacturer: Walsin Tech Corp; Manufacturer Part Number: MT18B223K500CT; Package Size: 0603; JLCPCB Basic Part: No; JLCPCB Part Number: C458958; Supplier 1: LCSC; Category: Capacitors - MLCC; Supplier Part Number 1: C458958; Tolerance: ±10%; Voltage Rating: 50V; Temperature Coefficient: X7R; RoHS: Yes; ComponentLink1Description: Datasheet; ComponentLink1URL: https://wmsc.lcsc.com/wmsc/upload/file/pdf/v2/lcsc/2304140030_Walsin-Tech-Corp-MT18B223K500CT_C458958.pdf; ComponentLink2Description: JLCPCB Part URL; ComponentLink2URL: https://jlcpcb.com/partdetail/C458958; ComponentLink3Description: LCSC Part URL; ComponentLink3URL: https://lcsc.com/product-detail/Multilayer-Ceramic-Capacitors-MLCC---SMD-SMT_Walsin-Tech-Corp-Walsin-Tech-Corp-MT18B223K500CT_C458958.html
footprint CAP-0603 (0603 (1608M) Capacitor)
pins: 1, 2

## MT18B332K250CT
designator C?  Capacitance: 3.3nF  (hidden comment: *)
Capacitor, Ceramic (MLCC), 3.3nF, ±10%, 25V, X7R, ±10%, SMD 0603; Manufacturer: Walsin Tech Corp; Manufacturer Part Number: MT18B332K250CT; Package Size: 0603; JLCPCB Basic Part: No; JLCPCB Part Number: C458959; Supplier 1: LCSC; Category: Capacitors - MLCC; Supplier Part Number 1: C458959; Tolerance: ±10%; Voltage Rating: 25V; Temperature Coefficient: X7R; RoHS: Yes; ComponentLink1Description: Datasheet; ComponentLink1URL: https://wmsc.lcsc.com/wmsc/upload/file/pdf/v2/lcsc/2304140030_Walsin-Tech-Corp-MT18B332K250CT_C458959.pdf; ComponentLink2Description: JLCPCB Part URL; ComponentLink2URL: https://jlcpcb.com/partdetail/C458959; ComponentLink3Description: LCSC Part URL; ComponentLink3URL: https://lcsc.com/product-detail/Multilayer-Ceramic-Capacitors-MLCC---SMD-SMT_Walsin-Tech-Corp-Walsin-Tech-Corp-MT18B332K250CT_C458959.html
footprint CAP-0603 (0603 (1608M) Capacitor)
pins: 1, 2

## MT18B332K500CT
designator C?  Capacitance: 3.3nF  (hidden comment: *)
Capacitor, Ceramic (MLCC), 3.3nF, ±10%, 50V, X7R, ±10%, SMD 0603; Manufacturer: Walsin Tech Corp; Manufacturer Part Number: MT18B332K500CT; Package Size: 0603; JLCPCB Basic Part: No; JLCPCB Part Number: C323566; Supplier 1: LCSC; Category: Capacitors - MLCC; Supplier Part Number 1: C323566; Tolerance: ±10%; Voltage Rating: 50V; Temperature Coefficient: X7R; RoHS: Yes; ComponentLink1Description: Datasheet; ComponentLink1URL: https://wmsc.lcsc.com/wmsc/upload/file/pdf/v2/lcsc/2304140030_Walsin-Tech-Corp-MT18B332K500CT_C323566.pdf; ComponentLink2Description: JLCPCB Part URL; ComponentLink2URL: https://jlcpcb.com/partdetail/C323566; ComponentLink3Description: LCSC Part URL; ComponentLink3URL: https://lcsc.com/product-detail/Multilayer-Ceramic-Capacitors-MLCC---SMD-SMT_Walsin-Tech-Corp-Walsin-Tech-Corp-MT18B332K500CT_C323566.html
footprint CAP-0603 (0603 (1608M) Capacitor)
pins: 1, 2

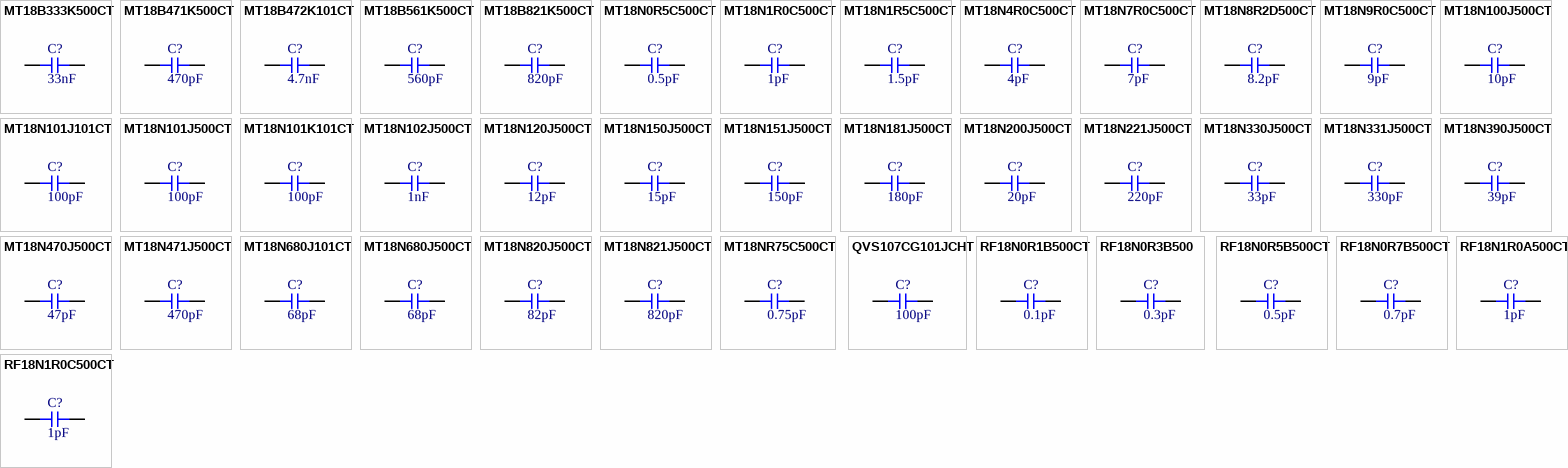
[diagram p83: symbols MT18B333K500CT to RF18N1R0C500CT]

## MT18B333K500CT
designator C?  Capacitance: 33nF  (hidden comment: *)
Capacitor, Ceramic (MLCC), 33nF, ±10%, 50V, X7R, ±10%, SMD 0603; Manufacturer: Walsin Tech Corp; Manufacturer Part Number: MT18B333K500CT; Package Size: 0603; JLCPCB Basic Part: No; JLCPCB Part Number: C323565; Supplier 1: LCSC; Category: Capacitors - MLCC; Supplier Part Number 1: C323565; Tolerance: ±10%; Voltage Rating: 50V; Temperature Coefficient: X7R; RoHS: Yes; ComponentLink1Description: Datasheet; ComponentLink1URL: https://wmsc.lcsc.com/wmsc/upload/file/pdf/v2/lcsc/2304140030_Walsin-Tech-Corp-MT18B333K500CT_C323565.pdf; ComponentLink2Description: JLCPCB Part URL; ComponentLink2URL: https://jlcpcb.com/partdetail/C323565; ComponentLink3Description: LCSC Part URL; ComponentLink3URL: https://lcsc.com/product-detail/Multilayer-Ceramic-Capacitors-MLCC---SMD-SMT_Walsin-Tech-Corp-Walsin-Tech-Corp-MT18B333K500CT_C323565.html
footprint CAP-0603 (0603 (1608M) Capacitor)
pins: 1, 2

## MT18B471K500CT
designator C?  Capacitance: 470pF  (hidden comment: *)
Capacitor, Ceramic (MLCC), 470pF, ±10%, 50V, X7R, ±10%, SMD 0603; Manufacturer: Walsin Tech Corp; Manufacturer Part Number: MT18B471K500CT; Package Size: 0603; JLCPCB Basic Part: No; JLCPCB Part Number: C908530; Supplier 1: LCSC; Category: Capacitors - MLCC; Supplier Part Number 1: C908530; Tolerance: ±10%; Voltage Rating: 50V; Temperature Coefficient: X7R; RoHS: Yes; ComponentLink1Description: Datasheet; ComponentLink1URL: https://wmsc.lcsc.com/wmsc/upload/file/pdf/v2/lcsc/2304140030_Walsin-Tech-Corp-MT18B471K500CT_C908530.pdf; ComponentLink2Description: JLCPCB Part URL; ComponentLink2URL: https://jlcpcb.com/partdetail/C908530; ComponentLink3Description: LCSC Part URL; ComponentLink3URL: https://lcsc.com/product-detail/Multilayer-Ceramic-Capacitors-MLCC---SMD-SMT_Walsin-Tech-Corp-Walsin-Tech-Corp-MT18B471K500CT_C908530.html
footprint CAP-0603 (0603 (1608M) Capacitor)
pins: 1, 2

## MT18B472K101CT
designator C?  Capacitance: 4.7nF  (hidden comment: *)
Capacitor, Ceramic (MLCC), 4.7nF, ±10%, 100V, X7R, ±10%, SMD 0603; Manufacturer: Walsin Tech Corp; Manufacturer Part Number: MT18B472K101CT; Package Size: 0603; JLCPCB Basic Part: No; JLCPCB Part Number: C458960; Supplier 1: LCSC; Category: Capacitors - MLCC; Supplier Part Number 1: C458960; Tolerance: ±10%; Voltage Rating: 100V; Temperature Coefficient: X7R; RoHS: Yes; ComponentLink1Description: Datasheet; ComponentLink1URL: https://wmsc.lcsc.com/wmsc/upload/file/pdf/v2/lcsc/2304140030_Walsin-Tech-Corp-MT18B472K101CT_C458960.pdf; ComponentLink2Description: JLCPCB Part URL; ComponentLink2URL: https://jlcpcb.com/partdetail/C458960; ComponentLink3Description: LCSC Part URL; ComponentLink3URL: https://lcsc.com/product-detail/Multilayer-Ceramic-Capacitors-MLCC---SMD-SMT_Walsin-Tech-Corp-Walsin-Tech-Corp-MT18B472K101CT_C458960.html
footprint CAP-0603 (0603 (1608M) Capacitor)
pins: 1, 2

## MT18B561K500CT
designator C?  Capacitance: 560pF  (hidden comment: *)
Capacitor, Ceramic (MLCC), 560pF, ±10%, 50V, X7R, ±10%, SMD 0603; Manufacturer: Walsin Tech Corp; Manufacturer Part Number: MT18B561K500CT; Package Size: 0603; JLCPCB Basic Part: No; JLCPCB Part Number: C458962; Supplier 1: LCSC; Category: Capacitors - MLCC; Supplier Part Number 1: C458962; Tolerance: ±10%; Voltage Rating: 50V; Temperature Coefficient: X7R; RoHS: Yes; ComponentLink1Description: Datasheet; ComponentLink1URL: https://wmsc.lcsc.com/wmsc/upload/file/pdf/v2/lcsc/2304140030_Walsin-Tech-Corp-MT18B561K500CT_C458962.pdf; ComponentLink2Description: JLCPCB Part URL; ComponentLink2URL: https://jlcpcb.com/partdetail/C458962; ComponentLink3Description: LCSC Part URL; ComponentLink3URL: https://lcsc.com/product-detail/Multilayer-Ceramic-Capacitors-MLCC---SMD-SMT_Walsin-Tech-Corp-Walsin-Tech-Corp-MT18B561K500CT_C458962.html
footprint CAP-0603 (0603 (1608M) Capacitor)
pins: 1, 2

## MT18B821K500CT
designator C?  Capacitance: 820pF  (hidden comment: *)
Capacitor, Ceramic (MLCC), 820pF, ±10%, 50V, X7R, ±10%, SMD 0603; Manufacturer: Walsin Tech Corp; Manufacturer Part Number: MT18B821K500CT; Package Size: 0603; JLCPCB Basic Part: No; JLCPCB Part Number: C908498; Supplier 1: LCSC; Category: Capacitors - MLCC; Supplier Part Number 1: C908498; Tolerance: ±10%; Voltage Rating: 50V; Temperature Coefficient: X7R; RoHS: Yes; ComponentLink1Description: Datasheet; ComponentLink1URL: https://wmsc.lcsc.com/wmsc/upload/file/pdf/v2/lcsc/2304140030_Walsin-Tech-Corp-MT18B821K500CT_C908498.pdf; ComponentLink2Description: JLCPCB Part URL; ComponentLink2URL: https://jlcpcb.com/partdetail/C908498; ComponentLink3Description: LCSC Part URL; ComponentLink3URL: https://lcsc.com/product-detail/Multilayer-Ceramic-Capacitors-MLCC---SMD-SMT_Walsin-Tech-Corp-Walsin-Tech-Corp-MT18B821K500CT_C908498.html
footprint CAP-0603 (0603 (1608M) Capacitor)
pins: 1, 2